# Altium footprint library Test.PcbLib: 245 footprints (part 11 of 17)
Each footprint in its own frame and in the unit in brackets; x right, y up, seen from the top. Pads: shape width x height; smd on the part's side, far side on the other; paste and mask are expansions set on the pad; w line width, h text height; cw(c..) or ccw(c..) is an arc to the next point about the centre after c.
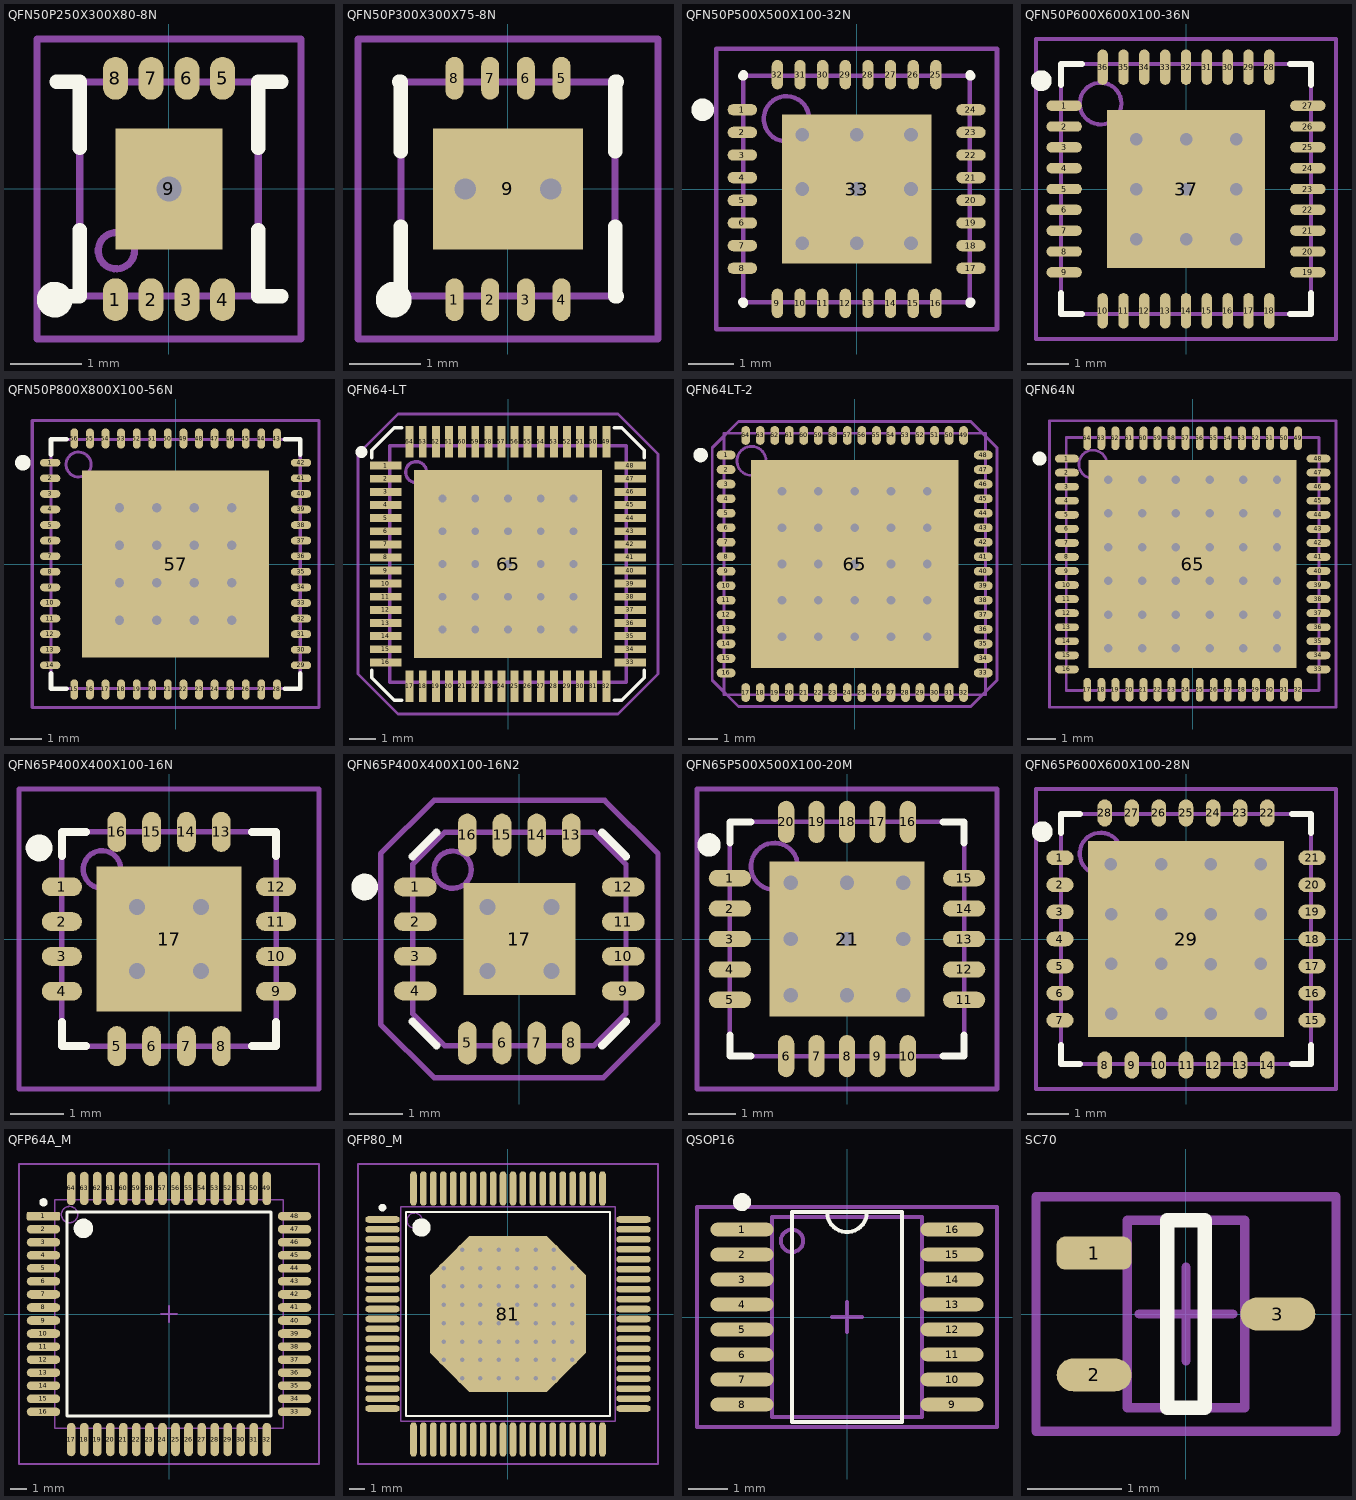
[diagram p10: the footprints below, top view; thin cyan lines are the x and y axes]

## QFN50P250X300X80-8N [mm] "QFN, 8-Leads, Body 3,0x2,5mm (max), Pitch 0,50mm, IPC Medium Density"
height 0.8
pads (9):
  oval 0.35x0.6 smd mask+0.051: 1(-0.75,-1.55) 2(-0.25,-1.55) 3(0.25,-1.55) 4(0.75,-1.55) 5(0.75,1.55) 6(0.25,1.55) 7(-0.25,1.55) 8(-0.75,1.55)
  rect 1.5x1.7 smd paste-7 mask-7: 9(0,0)
via 0,0 diameter 0.7 hole 0.35
Top Overlay:
  circle w0.25: c-1.6,-1.55 r0.125
  lines w0.2: -1.575,-1.5 -1.25,-1.5 -1.25,-0.575 ; -1.575,1.5 -1.25,1.5 -1.25,0.575 ; 1.25,-0.575 1.25,-1.5 1.575,-1.5 ; 1.25,0.575 1.25,1.5 1.575,1.5
Top Paste:
  region: -0.75,0.85 -0.175,0.85 -0.175,0.3 -0.3,0.175 -0.75,0.175
  region: 0.75,0.85 0.175,0.85 0.175,0.3 0.3,0.175 0.75,0.175
  region: 0.75,-0.85 0.175,-0.85 0.175,-0.3 0.3,-0.175 0.75,-0.175
  region: -0.75,-0.85 -0.175,-0.85 -0.175,-0.3 -0.3,-0.175 -0.75,-0.175
Top Solder:
  circle w0.102: c0,0 r0.42
  region: -0.8,0.9 0.8,0.9 0.8,-0.9 0,-0.9 0,-0.4 0.178,-0.381 0.254,-0.33 0.305,-0.254 0.381,-0.152 0.406,-0.025 0.406,0.102 0.381,0.203 0.305,0.279 0.229,0.33 0.127,0.406 -0.178,0.406 -0.356,0.229 -0.381,0.102 -0.406,-0.051 -0.406,-0.152 -0.33,-0.254 -0.178,-0.356 -0.127,-0.406 0,-0.432 0,-0.9 -0.8,-0.9
Mechanical 13:
  circle w0.1: c-0.737,-0.864 r0.254
  lines w0.1: -1.25,-1.5 1.25,-1.5 1.25,1.5 -1.25,1.5 -1.25,-1.5
Mechanical 15:
  lines w0.1: -0.5,0 0.5,0 ; 0,-0.5 0,0.5 ; -1.85,-2.1 1.85,-2.1 1.85,2.1 -1.85,2.1 -1.85,-2.1
3D body: height 0.81, standoff 0.8, extent -0.996,-1.123 -0.478,-0.605
3D body: height 0.8, standoff 0.05, extent -1.25,-1.5 1.25,1.5

## QFN50P300X300X75-8N [mm] "QFN, 8-Leads, Body 3,0x3,0mm (max), Pitch 0,50mm, IPC Medium Density"
height 0.75
pads (9):
  oval 0.25x0.6 smd mask+0.051: 1(-0.75,-1.55) 2(-0.25,-1.55) 3(0.25,-1.55) 4(0.75,-1.55) 5(0.75,1.55) 6(0.25,1.55) 7(-0.25,1.55) 8(-0.75,1.55)
  rect 2.1x1.7 smd paste-7 mask-7: 9(0,0)
via 0.6,0 diameter 0.65 hole 0.3
via -0.6,0 diameter 0.65 hole 0.3
Top Overlay:
  circle w0.25: c-1.6,-1.55 r0.125
  lines w0.2: -1.525,-1.5 -1.5,-1.5 -1.5,-0.525 ; -1.525,1.5 -1.5,1.5 -1.5,0.525 ; 1.5,-0.525 1.5,-1.5 1.525,-1.5 ; 1.5,0.525 1.5,1.5 1.525,1.5
Top Paste:
  region: -0.279,-0.127 -0.61,-0.457 -1.041,-0.457 -1.041,-0.838 1.041,-0.838 1.041,-0.457 0.61,-0.457 0.279,-0.127
  region: -0.279,0.127 -0.61,0.457 -1.041,0.457 -1.041,0.838 1.041,0.838 1.041,0.457 0.61,0.457 0.279,0.127
Top Solder:
  circle w0.102: c0.6,0 r0.406
  circle w0.102: c-0.6,0 r0.406
  region: 1.168,0.965 0,0.965 0,-0.965 1.168,-0.965 1.168,0 1.016,0 0.991,-0.152 0.914,-0.229 0.864,-0.33 0.711,-0.381 0.533,-0.406 0.406,-0.381 0.305,-0.305 0.229,-0.178 0.194,0 0.229,0.127 0.305,0.254 0.432,0.381 0.61,0.406 0.737,0.356 0.889,0.279 0.991,0.127 1.016,0.025 1.016,0 1.168,0
  region: -1.168,0.965 0,0.965 0,-0.965 -1.168,-0.965 -1.168,0 -1.016,0 -0.991,-0.152 -0.914,-0.229 -0.864,-0.33 -0.711,-0.381 -0.533,-0.406 -0.406,-0.381 -0.305,-0.305 -0.229,-0.178 -0.194,0 -0.229,0.127 -0.305,0.254 -0.432,0.381 -0.61,0.406 -0.737,0.356 -0.889,0.279 -0.991,0.127 -1.016,0.025 -1.016,0 -1.168,0
Mechanical 13:
  lines w0.1: -1.5,-1.5 1.5,-1.5 1.5,1.5 -1.5,1.5 -1.5,-1.5
Mechanical 15:
  lines w0.1: -0.5,0 0.5,0 ; 0,-0.5 0,0.5 ; -2.1,-2.1 2.1,-2.1 2.1,2.1 -2.1,2.1 -2.1,-2.1
3D body: height 0.76, standoff 0.75, extent -1.035,-1.143 -0.438,-0.544
3D body: height 0.75, standoff 0.05, extent -1.5,-1.5 1.5,1.5

## QFN50P500X500X100-32N [mm] "QFN, 32-Leads, Body 5,0x5,0mm (max), Pitch 0,50mm, IPC Medium Density"
height 1
pads (33):
  oval 0.65x0.25 smd mask+0.051: 1(-2.525,1.75) 2(-2.525,1.25) 3(-2.525,0.75) 4(-2.525,0.25) 5(-2.525,-0.25) 6(-2.525,-0.75) 7(-2.525,-1.25) 8(-2.525,-1.75) 17(2.525,-1.75) 18(2.525,-1.25) 19(2.525,-0.75) 20(2.525,-0.25) 21(2.525,0.25) 22(2.525,0.75) 23(2.525,1.25) 24(2.525,1.75)
  oval 0.25x0.65 smd mask+0.051: 9(-1.75,-2.525) 10(-1.25,-2.525) 11(-0.75,-2.525) 12(-0.25,-2.525) 13(0.25,-2.525) 14(0.75,-2.525) 15(1.25,-2.525) 16(1.75,-2.525) 25(1.75,2.525) 26(1.25,2.525) 27(0.75,2.525) 28(0.25,2.525) 29(-0.25,2.525) 30(-0.75,2.525) 31(-1.25,2.525) 32(-1.75,2.525)
  rect 3.3x3.3 smd paste-7 mask-7: 33(0,0)
via 1.2,-1.2 diameter 0.65 hole 0.3
via 0,-1.2 diameter 0.65 hole 0.3
via -1.2,-1.2 diameter 0.65 hole 0.3
via 1.2,0 diameter 0.65 hole 0.3
via 0,0 diameter 0.65 hole 0.3
via -1.2,0 diameter 0.65 hole 0.3
via 1.2,1.2 diameter 0.65 hole 0.3
via 0,1.2 diameter 0.65 hole 0.3
via -1.2,1.2 diameter 0.65 hole 0.3
Top Overlay:
  circle w0.25: c-3.4,1.75 r0.125
  lines w0.2: -2.525,-2.5 -2.5,-2.5 -2.5,-2.525 ; -2.525,2.5 -2.5,2.5 -2.5,2.525 ; 2.5,-2.525 2.5,-2.5 2.525,-2.5 ; 2.5,2.525 2.5,2.5 2.525,2.5
Top Paste:
  region: -1.321,0.33 -1.448,0.203 -1.626,0.203 -1.626,1.067 -1.473,1.067 -1.321,0.914
  region: -1.321,-0.864 -1.448,-0.991 -1.626,-0.991 -1.626,-0.127 -1.473,-0.127 -1.321,-0.279
  region: -0.305,-1.346 -0.178,-1.473 -0.178,-1.651 -1.041,-1.651 -1.041,-1.499 -0.889,-1.346
  region: 0.889,-1.346 1.016,-1.473 1.016,-1.651 0.152,-1.651 0.152,-1.499 0.305,-1.346
  region: 1.321,-0.33 1.448,-0.203 1.626,-0.203 1.626,-1.067 1.473,-1.067 1.321,-0.914
  region: 1.321,0.864 1.448,0.991 1.626,0.991 1.626,0.127 1.473,0.127 1.321,0.279
  region: 0.305,1.346 0.178,1.473 0.178,1.651 1.041,1.651 1.041,1.499 0.889,1.346
  region: -0.889,1.346 -1.016,1.473 -1.016,1.651 -0.152,1.651 -0.152,1.499 -0.305,1.346
  region: -1.041,-0.914 -0.889,-1.067 -0.305,-1.067 -0.152,-0.914 -0.152,-0.279 -0.305,-0.127 -0.889,-0.127 -1.041,-0.279
  region: 1.041,-0.914 0.889,-1.067 0.305,-1.067 0.152,-0.914 0.152,-0.279 0.305,-0.127 0.889,-0.127 1.041,-0.279
  region: 1.041,0.914 0.889,1.067 0.305,1.067 0.152,0.914 0.152,0.279 0.305,0.127 0.889,0.127 1.041,0.279
  region: -1.041,0.914 -0.889,1.067 -0.305,1.067 -0.152,0.914 -0.152,0.279 -0.305,0.127 -0.889,0.127 -1.041,0.279
Top Solder:
  drawing of 18 lines, arcs and shapes, not listed
Mechanical 13:
  circle w0.1: c-1.55,1.55 r0.5
  lines w0.1: -2.5,-2.5 2.5,-2.5 2.5,2.5 -2.5,2.5 -2.5,-2.5
Mechanical 15:
  lines w0.1: -0.5,0 0.5,0 ; 0,-0.5 0,0.5 ; -3.1,-3.1 3.1,-3.1 3.1,3.1 -3.1,3.1 -3.1,-3.1
3D body: height 1.01, standoff 1, extent -2.047,1.041 -1.051,2.039
3D body: height 1, standoff 0.05, extent -2.5,-2.5 2.5,2.5

## QFN50P600X600X100-36N [mm] "QFN, 36-Leads, Body 6,0x6,0mm (max), Pitch 0,50mm, IPC Medium Density"
height 1
pads (37):
  oval 0.85x0.25 smd mask+0.038: 1(-2.925,2) 2(-2.925,1.5) 3(-2.925,1) 4(-2.925,0.5) 5(-2.925,0) 6(-2.925,-0.5) 7(-2.925,-1) 8(-2.925,-1.5) 9(-2.925,-2) 19(2.925,-2) 20(2.925,-1.5) 21(2.925,-1) 22(2.925,-0.5) 23(2.925,0) 24(2.925,0.5) 25(2.925,1) 26(2.925,1.5) 27(2.925,2)
  oval 0.25x0.85 smd mask+0.038: 10(-2,-2.925) 11(-1.5,-2.925) 12(-1,-2.925) 13(-0.5,-2.925) 14(0,-2.925) 15(0.5,-2.925) 16(1,-2.925) 17(1.5,-2.925) 18(2,-2.925) 28(2,2.925) 29(1.5,2.925) 30(1,2.925) 31(0.5,2.925) 32(0,2.925) 33(-0.5,2.925) 34(-1,2.925) 35(-1.5,2.925) 36(-2,2.925)
  rect 3.8x3.8 smd paste-4 mask-4: 37(0,0)
via -1.2,1.2 diameter 0.6 hole 0.3
via 0,1.2 diameter 0.6 hole 0.3
via 1.2,1.2 diameter 0.6 hole 0.3
via -1.2,0 diameter 0.6 hole 0.3
via 0,0 diameter 0.6 hole 0.3
via 1.2,0 diameter 0.6 hole 0.3
via -1.2,-1.2 diameter 0.6 hole 0.3
via 0,-1.2 diameter 0.6 hole 0.3
via 1.2,-1.2 diameter 0.6 hole 0.3
Top Overlay:
  circle w0.25: c-3.475,2.6 r0.125
  lines w0.15: -3,-2.5 -3,-3 -2.5,-3 ; -3,2.5 -3,3 -2.5,3 ; 2.5,-3 3,-3 3,-2.5 ; 2.5,3 3,3 3,2.5
Top Paste:
  region: -1.8,-1.8 -1.8,-1.325 -1.575,-1.325 -1.35,-1.55 -1.35,-1.8
  region: -1.8,1.8 -1.325,1.8 -1.325,1.575 -1.55,1.35 -1.8,1.35
  region: 1.8,1.8 1.8,1.325 1.575,1.325 1.35,1.55 1.35,1.8
  region: -1.05,-0.85 -0.85,-1.05 -0.35,-1.05 -0.15,-0.85 -0.15,-0.35 -0.35,-0.15 -0.85,-0.15 -1.05,-0.35
  region: -0.85,1.05 -1.05,0.85 -1.05,0.35 -0.85,0.15 -0.35,0.15 -0.15,0.35 -0.15,0.85 -0.35,1.05
  region: 1.05,0.85 0.85,1.05 0.35,1.05 0.15,0.85 0.15,0.35 0.35,0.15 0.85,0.15 1.05,0.35
  region: 1.8,-0.15 1.55,-0.15 1.35,-0.35 1.35,-0.85 1.55,-1.05 1.8,-1.05
  region: 1.8,1.05 1.55,1.05 1.35,0.85 1.35,0.35 1.55,0.15 1.8,0.15
  region: 0.15,1.8 0.15,1.55 0.35,1.35 0.85,1.35 1.05,1.55 1.05,1.8
  region: -1.05,1.8 -1.05,1.55 -0.85,1.35 -0.35,1.35 -0.15,1.55 -0.15,1.8
  region: -1.8,0.15 -1.55,0.15 -1.35,0.35 -1.35,0.85 -1.55,1.05 -1.8,1.05
  region: -1.8,-1.05 -1.55,-1.05 -1.35,-0.85 -1.35,-0.35 -1.55,-0.15 -1.8,-0.15
  region: -0.15,-1.8 -0.15,-1.55 -0.35,-1.35 -0.85,-1.35 -1.05,-1.55 -1.05,-1.8
  region: 0.85,-1.05 1.05,-0.85 1.05,-0.35 0.85,-0.15 0.35,-0.15 0.15,-0.35 0.15,-0.85 0.35,-1.05
  region: 1.05,-1.8 1.05,-1.55 0.85,-1.35 0.35,-1.35 0.15,-1.55 0.15,-1.8
  region: 1.8,-1.8 1.325,-1.8 1.325,-1.575 1.55,-1.35 1.8,-1.35
Top Solder:
  drawing of 1 lines, arcs and shapes, not listed
Mechanical 13:
  circle w0.1: c-2.05,2.05 r0.5
  lines w0.1: -3,-3 -3,3 3,3 3,-3 -3,-3
Mechanical 15:
  lines w0.1: -0.5,0 0.5,0 ; 0,-0.5 0,0.5 ; -3.6,-3.6 -3.6,3.6 3.6,3.6 3.6,-3.6 -3.6,-3.6
3D body: height 1.01, standoff 1, extent -2.455,1.634 -1.639,2.45
3D body: height 1, standoff 0.22, extent -2.85,-2.85 2.85,2.85
3D body: height 0.22, standoff 0.02, extent -3,-3 3,3

## QFN50P800X800X100-56N [mm] "QFN, 56-Leads, Body 8,0x8,0mm (max), Pitch 0,50mm, IPC Medium Density"
height 1
pads (57):
  oval 0.65x0.25 smd mask+0.038: 1(-4.025,3.25) 2(-4.025,2.75) 3(-4.025,2.25) 4(-4.025,1.75) 5(-4.025,1.25) 6(-4.025,0.75) 7(-4.025,0.25) 8(-4.025,-0.25) 9(-4.025,-0.75) 10(-4.025,-1.25) 11(-4.025,-1.75) 12(-4.025,-2.25) 13(-4.025,-2.75) 14(-4.025,-3.25) 29(4.025,-3.25) 30(4.025,-2.75) 31(4.025,-2.25) 32(4.025,-1.75) 33(4.025,-1.25) 34(4.025,-0.75) 35(4.025,-0.25) 36(4.025,0.25) 37(4.025,0.75) 38(4.025,1.25) 39(4.025,1.75) 40(4.025,2.25) 41(4.025,2.75) 42(4.025,3.25)
  oval 0.25x0.65 smd mask+0.038: 15(-3.25,-4.025) 16(-2.75,-4.025) 17(-2.25,-4.025) 18(-1.75,-4.025) 19(-1.25,-4.025) 20(-0.75,-4.025) 21(-0.25,-4.025) 22(0.25,-4.025) 23(0.75,-4.025) 24(1.25,-4.025) 25(1.75,-4.025) 26(2.25,-4.025) 27(2.75,-4.025) 28(3.25,-4.025) 43(3.25,4.025) 44(2.75,4.025) 45(2.25,4.025) 46(1.75,4.025) 47(1.25,4.025) 48(0.75,4.025) 49(0.25,4.025) 50(-0.25,4.025) 51(-0.75,4.025) 52(-1.25,4.025) 53(-1.75,4.025) 54(-2.25,4.025) 55(-2.75,4.025) 56(-3.25,4.025)
  rect 6x6 smd paste-5 mask-5: 57(0,0)
via -1.8,1.8 diameter 0.65 hole 0.3
via -0.6,1.8 diameter 0.65 hole 0.3
via 0.6,1.8 diameter 0.65 hole 0.3
via 1.8,1.8 diameter 0.65 hole 0.3
via -1.8,0.6 diameter 0.65 hole 0.3
via -0.6,0.6 diameter 0.65 hole 0.3
via 0.6,0.6 diameter 0.65 hole 0.3
via 1.8,0.6 diameter 0.65 hole 0.3
via -1.8,-0.6 diameter 0.65 hole 0.3
via -0.6,-0.6 diameter 0.65 hole 0.3
via 0.6,-0.6 diameter 0.65 hole 0.3
via 1.8,-0.6 diameter 0.65 hole 0.3
via -1.8,-1.8 diameter 0.65 hole 0.3
via -0.6,-1.8 diameter 0.65 hole 0.3
via 0.6,-1.8 diameter 0.65 hole 0.3
via 1.8,-1.8 diameter 0.65 hole 0.3
Top Overlay:
  circle w0.25: c-4.9,3.25 r0.125
  lines w0.15: -4,-3.5 -4,-4 -3.5,-4 ; -4,3.5 -4,4 -3.5,4 ; 3.5,-4 4,-4 4,-3.5 ; 3.5,4 4,4 4,3.5
Top Paste:
  drawing of 25 lines, arcs and shapes, not listed
Top Solder:
  drawing of 1 lines, arcs and shapes, not listed
Mechanical 13:
  circle w0.1: c-3.114,3.192 r0.4
  lines w0.1: -4,-4 -4,4 4,4 4,-4 -4,-4
Mechanical 15:
  lines w0.1: -0.5,0 0.5,0 ; 0,-0.5 0,0.5 ; -4.6,-4.6 -4.6,4.6 4.6,4.6 4.6,-4.6 -4.6,-4.6
3D body: height 1.01, standoff 1, extent -3.53,2.784 -2.714,3.6
3D body: height 1, standoff 0.2, extent -3.85,-3.85 3.85,3.85
3D body: height 0.2, standoff 0.01, extent -4,-4 4,4

## QFN64-LT [mm] "QFN64; 64 Leads; Body Width 9.0 mm; Pitch 0.5 mm"
pads (65):
  rect 1.2x0.3 smd mask+0.051: 1(-4.65,3.75) 2(-4.65,3.25) 3(-4.65,2.75) 4(-4.65,2.25) 5(-4.65,1.75) 6(-4.65,1.25) 7(-4.65,0.75) 8(-4.65,0.25) 9(-4.65,-0.25) 10(-4.65,-0.75) 11(-4.65,-1.25) 12(-4.65,-1.75) 13(-4.65,-2.25) 14(-4.65,-2.75) 15(-4.65,-3.25) 16(-4.65,-3.75) 33(4.65,-3.75) 34(4.65,-3.25) 35(4.65,-2.75) 36(4.65,-2.25) 37(4.65,-1.75) 38(4.65,-1.25) 39(4.65,-0.75) 40(4.65,-0.25) 41(4.65,0.25) 42(4.65,0.75) 43(4.65,1.25) 44(4.65,1.75) 45(4.65,2.25) 46(4.65,2.75) 47(4.65,3.25) 48(4.65,3.75)
  rect 0.3x1.2 smd mask+0.051: 17(-3.75,-4.65) 18(-3.25,-4.65) 19(-2.75,-4.65) 20(-2.25,-4.65) 21(-1.75,-4.65) 22(-1.25,-4.65) 23(-0.75,-4.65) 24(-0.25,-4.65) 25(0.25,-4.65) 26(0.75,-4.65) 27(1.25,-4.65) 28(1.75,-4.65) 29(2.25,-4.65) 30(2.75,-4.65) 31(3.25,-4.65) 32(3.75,-4.65) 49(3.75,4.65) 50(3.25,4.65) 51(2.75,4.65) 52(2.25,4.65) 53(1.75,4.65) 54(1.25,4.65) 55(0.75,4.65) 56(0.25,4.65) 57(-0.25,4.65) 58(-0.75,4.65) 59(-1.25,4.65) 60(-1.75,4.65) 61(-2.25,4.65) 62(-2.75,4.65) 63(-3.25,4.65) 64(-3.75,4.65)
  rect 7.15x7.15 smd paste-5 mask+0.102: 65(0,0)
via 0,0 diameter 0.7 hole 0.3
via 1.25,0 diameter 0.7 hole 0.3
via 2.5,0 diameter 0.7 hole 0.3
via 2.5,1.25 diameter 0.7 hole 0.3
via 2.5,2.5 diameter 0.7 hole 0.3
via 1.25,2.5 diameter 0.7 hole 0.3
via 1.25,1.25 diameter 0.7 hole 0.3
via 0,1.25 diameter 0.7 hole 0.3
via 0,2.5 diameter 0.7 hole 0.3
via -1.25,2.5 diameter 0.7 hole 0.3
via -2.5,2.5 diameter 0.7 hole 0.3
via -2.5,1.25 diameter 0.7 hole 0.3
via -1.25,1.25 diameter 0.7 hole 0.3
via -1.25,0 diameter 0.7 hole 0.3
via -2.5,0 diameter 0.7 hole 0.3
via -2.5,-1.25 diameter 0.7 hole 0.3
via -1.25,-1.25 diameter 0.7 hole 0.3
via 0,-1.25 diameter 0.7 hole 0.3
via 1.25,-1.25 diameter 0.7 hole 0.3
via 2.5,-1.25 diameter 0.7 hole 0.3
via 2.5,-2.5 diameter 0.7 hole 0.3
via 1.25,-2.5 diameter 0.7 hole 0.3
via 0,-2.5 diameter 0.7 hole 0.3
via -1.25,-2.5 diameter 0.7 hole 0.3
via -2.5,-2.5 diameter 0.7 hole 0.3
Top Overlay:
  circle w0.254: c-5.586,4.267 r0.1
  lines w0.127: -5.186,-4.05 -5.186,-4.339 -4.339,-5.186 -4.05,-5.186 ; -5.186,4.05 -5.186,4.339 -4.339,5.186 -4.05,5.186 ; 4.05,-5.186 4.339,-5.186 5.186,-4.339 5.186,-4.05 ; 4.05,5.186 4.339,5.186 5.186,4.339 5.186,4.05
Top Paste:
  drawing of 36 lines, arcs and shapes, not listed
Top Solder:
  drawing of 1 lines, arcs and shapes, not listed
Mechanical 12:
  circle w0.4: c-2.5,2.5 r0.15
  circle w0.4: c-1.25,2.5 r0.15
  circle w0.4: c0,2.5 r0.15
  circle w0.4: c1.25,2.5 r0.15
  circle w0.4: c2.5,2.5 r0.15
  circle w0.4: c-2.5,1.25 r0.15
  circle w0.4: c-1.25,1.25 r0.15
  circle w0.4: c0,1.25 r0.15
  circle w0.4: c1.25,1.25 r0.15
  circle w0.4: c2.5,1.25 r0.15
  circle w0.4: c-2.5,0 r0.15
  circle w0.4: c-1.25,0 r0.15
  circle w0.4: c0,0 r0.15
  circle w0.4: c1.25,0 r0.15
  circle w0.4: c2.5,0 r0.15
  circle w0.4: c-2.5,-1.25 r0.15
  circle w0.4: c-1.25,-1.25 r0.15
  circle w0.4: c0,-1.25 r0.15
  circle w0.4: c1.25,-1.25 r0.15
  circle w0.4: c2.5,-1.25 r0.15
  circle w0.4: c-2.5,-2.5 r0.15
  circle w0.4: c-1.25,-2.5 r0.15
  circle w0.4: c0,-2.5 r0.15
  circle w0.4: c1.25,-2.5 r0.15
  circle w0.4: c2.5,-2.5 r0.15
Mechanical 13:
  circle w0.127: c-3.5,3.5 r0.4
  lines w0.127: -4.5,-4.5 4.5,-4.5 4.5,4.5 -4.5,4.5 -4.5,-4.5
Mechanical 15:
  lines w0.1: -0.5,0 0.5,0 ; 0,-0.5 0,0.5
  lines w0.102: -5.715,-4.191 -4.191,-5.715 4.191,-5.715 5.715,-4.191 5.715,4.191 4.191,5.715 -4.191,5.715 -5.715,4.191 -5.715,-4.191
3D body: height 0.76, standoff 0.75, extent -3.908,3.092 -3.092,3.908
3D body: height 0.75, standoff 0, extent -4.5,-4.5 4.5,4.5

## QFN64LT-2 [mm]
height 0.75
pads (65):
  oval 0.65x0.3 smd mask+0.038: 1(-4.425,3.75) 2(-4.425,3.25) 3(-4.425,2.75) 4(-4.425,2.25) 5(-4.425,1.75) 6(-4.425,1.25) 7(-4.425,0.75) 8(-4.425,0.25) 9(-4.425,-0.25) 10(-4.425,-0.75) 11(-4.425,-1.25) 12(-4.425,-1.75) 13(-4.425,-2.25) 14(-4.425,-2.75) 15(-4.425,-3.25) 16(-4.425,-3.75) 33(4.425,-3.75) 34(4.425,-3.25) 35(4.425,-2.75) 36(4.425,-2.25) 37(4.425,-1.75) 38(4.425,-1.25) 39(4.425,-0.75) 40(4.425,-0.25) 41(4.425,0.25) 42(4.425,0.75) 43(4.425,1.25) 44(4.425,1.75) 45(4.425,2.25) 46(4.425,2.75) 47(4.425,3.25) 48(4.425,3.75)
  oval 0.3x0.65 smd mask+0.038: 17(-3.75,-4.425) 18(-3.25,-4.425) 19(-2.75,-4.425) 20(-2.25,-4.425) 21(-1.75,-4.425) 22(-1.25,-4.425) 23(-0.75,-4.425) 24(-0.25,-4.425) 25(0.25,-4.425) 26(0.75,-4.425) 27(1.25,-4.425) 28(1.75,-4.425) 29(2.25,-4.425) 30(2.75,-4.425) 31(3.25,-4.425) 32(3.75,-4.425) 49(3.75,4.425) 50(3.25,4.425) 51(2.75,4.425) 52(2.25,4.425) 53(1.75,4.425) 54(1.25,4.425) 55(0.75,4.425) 56(0.25,4.425) 57(-0.25,4.425) 58(-0.75,4.425) 59(-1.25,4.425) 60(-1.75,4.425) 61(-2.25,4.425) 62(-2.75,4.425) 63(-3.25,4.425) 64(-3.75,4.425)
  rect 7.15x7.15 smd paste-5 mask+0.102: 65(0,0)
via 0,0 diameter 0.7 hole 0.3
via 1.25,0 diameter 0.7 hole 0.3
via 2.5,0 diameter 0.7 hole 0.3
via 2.5,1.25 diameter 0.7 hole 0.3
via 2.5,2.5 diameter 0.7 hole 0.3
via 1.25,2.5 diameter 0.7 hole 0.3
via 1.25,1.25 diameter 0.7 hole 0.3
via 0,1.25 diameter 0.7 hole 0.3
via 0,2.5 diameter 0.7 hole 0.3
via -1.25,2.5 diameter 0.7 hole 0.3
via -2.5,2.5 diameter 0.7 hole 0.3
via -2.5,1.25 diameter 0.7 hole 0.3
via -1.25,1.25 diameter 0.7 hole 0.3
via -1.25,0 diameter 0.7 hole 0.3
via -2.5,0 diameter 0.7 hole 0.3
via -2.5,-1.25 diameter 0.7 hole 0.3
via -1.25,-1.25 diameter 0.7 hole 0.3
via 0,-1.25 diameter 0.7 hole 0.3
via 1.25,-1.25 diameter 0.7 hole 0.3
via 2.5,-1.25 diameter 0.7 hole 0.3
via 2.5,-2.5 diameter 0.7 hole 0.3
via 1.25,-2.5 diameter 0.7 hole 0.3
via 0,-2.5 diameter 0.7 hole 0.3
via -1.25,-2.5 diameter 0.7 hole 0.3
via -2.5,-2.5 diameter 0.7 hole 0.3
Top Overlay:
  circle w0.25: c-5.3,3.75 r0.125
Top Paste:
  drawing of 36 lines, arcs and shapes, not listed
Top Solder:
  drawing of 1 lines, arcs and shapes, not listed
Mechanical 12:
  circle w0.4: c-2.5,2.5 r0.15
  circle w0.4: c-1.25,2.5 r0.15
  circle w0.4: c0,2.5 r0.15
  circle w0.4: c1.25,2.5 r0.15
  circle w0.4: c2.5,2.5 r0.15
  circle w0.4: c-2.5,1.25 r0.15
  circle w0.4: c-1.25,1.25 r0.15
  circle w0.4: c0,1.25 r0.15
  circle w0.4: c1.25,1.25 r0.15
  circle w0.4: c2.5,1.25 r0.15
  circle w0.4: c-2.5,0 r0.15
  circle w0.4: c-1.25,0 r0.15
  circle w0.4: c0,0 r0.15
  circle w0.4: c1.25,0 r0.15
  circle w0.4: c2.5,0 r0.15
  circle w0.4: c-2.5,-1.25 r0.15
  circle w0.4: c-1.25,-1.25 r0.15
  circle w0.4: c0,-1.25 r0.15
  circle w0.4: c1.25,-1.25 r0.15
  circle w0.4: c2.5,-1.25 r0.15
  circle w0.4: c-2.5,-2.5 r0.15
  circle w0.4: c-1.25,-2.5 r0.15
  circle w0.4: c0,-2.5 r0.15
  circle w0.4: c1.25,-2.5 r0.15
  circle w0.4: c2.5,-2.5 r0.15
Mechanical 13:
  circle w0.1: c-3.55,3.55 r0.5
  lines w0.1: -4.5,-4.5 4.5,-4.5 4.5,4.5 -4.5,4.5 -4.5,-4.5
Mechanical 15:
  lines w0.1: -0.5,0 0.5,0 ; 0,-0.5 0,0.5 ; -4.9,-4 -4,-4.9 4,-4.9 4.9,-4 4.9,4 4,4.9 -4,4.9 -4.9,4 -4.9,-4